# Altium footprint library 4.11-MX1.25连接器.PcbLib: 64 footprints (part 3 of 4)
Each footprint in its own frame and in the unit in brackets; x right, y up, seen from the top. Pads: shape width x height; smd on the part's side, far side on the other; paste and mask are expansions set on the pad; w line width, h text height; cw(c..) or ccw(c..) is an arc to the next point about the centre after c.
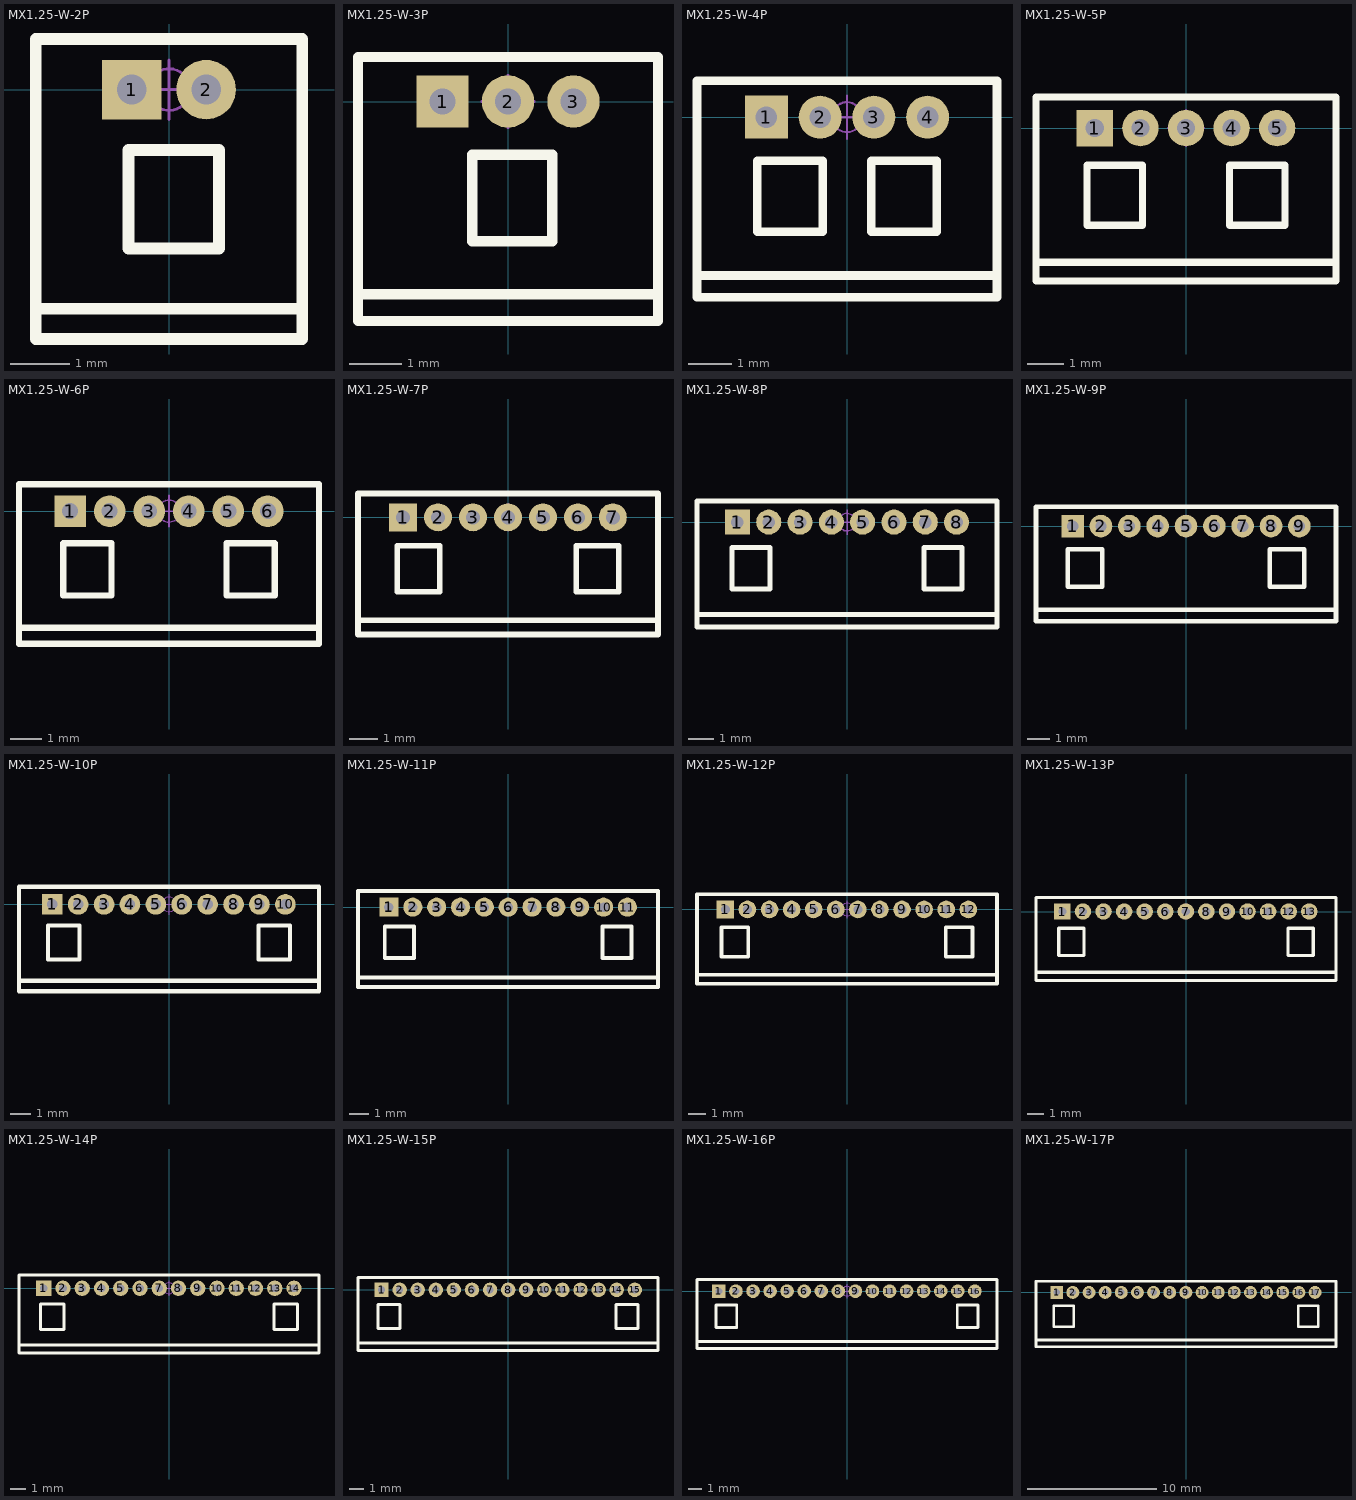
[diagram p2: the footprints below, top view; thin cyan lines are the x and y axes]

## MX1.25-W-2P [mm] "长：4.25mm，宽：1.8mm，高：3.3mm"
pads (2):
  rect 1x1 hole 0.5: 1(-0.625,0)
  round 1 hole 0.5: 2(0.625,0)
Top Overlay:
  lines w0.2: -2.239,-3.683 2.239,-3.683 ; -2.239,-4.191 2.239,-4.191 2.239,0.85 -2.239,0.85 -2.239,-4.191 ; -0.682,-2.667 0.842,-2.667 0.842,-1.016 -0.682,-1.016 -0.682,-2.667
Mechanical 15:
  circle w0.05: c0,0 r0.35
  lines w0.05: -0.5,0 0.5,0 ; 0,-0.5 0,0.5
3D body: height 3.35, standoff -2.1, extent -2.125,-4.05 2.125,0.85

## MX1.25-W-3P [mm] "长：5.5mm，宽：1.8mm，高：3.3mm"
pads (3):
  rect 1x1 hole 0.5: 1(-1.25,0)
  round 1 hole 0.5: 2(0,0) 3(1.25,0)
Top Overlay:
  lines w0.2: -2.864,-3.683 2.864,-3.683 ; -2.864,-4.191 -2.864,0.85 2.864,0.85 2.864,-4.191 -2.864,-4.191 ; -0.682,-2.667 -0.682,-1.016 0.842,-1.016 0.842,-2.667 -0.682,-2.667
Mechanical 15:
  circle w0.05: c0,0 r0.35
  lines w0.05: -0.5,0 0.5,0 ; 0,-0.5 0,0.5
3D body: height 3.35, standoff -2.1, extent -2.75,-4.05 2.75,0.85

## MX1.25-W-4P [mm] "长：6.75mm，宽：1.8mm，高：3.3mm"
pads (4):
  rect 1x1 hole 0.5: 1(-1.875,0)
  round 1 hole 0.5: 2(-0.625,0) 3(0.625,0) 4(1.875,0)
Top Overlay:
  lines w0.2: -3.489,-3.683 3.489,-3.683 ; -3.489,-4.191 -3.489,0.85 3.489,0.85 3.489,-4.191 -3.489,-4.191 ; -2.092,-2.667 -0.568,-2.667 -0.568,-1.016 -2.092,-1.016 -2.092,-2.667 ; 0.568,-2.667 2.092,-2.667 2.092,-1.016 0.568,-1.016 0.568,-2.667
Mechanical 15:
  circle w0.05: c0,0 r0.35
  lines w0.05: -0.5,0 0.5,0 ; 0,-0.5 0,0.5
3D body: height 1.59, standoff -3.86, extent -3.375,-4.05 3.375,0.85

## MX1.25-W-5P [mm] "长：8mm，宽：1.8mm，高：3.3mm"
pads (5):
  rect 1x1 hole 0.5: 1(-2.5,0)
  round 1 hole 0.5: 2(-1.25,0) 3(0,0) 4(1.25,0) 5(2.5,0)
Top Overlay:
  lines w0.2: -4.114,-3.683 4.114,-3.683 ; -4.114,-4.191 -4.114,0.85 4.114,0.85 4.114,-4.191 -4.114,-4.191 ; -2.717,-2.667 -1.193,-2.667 -1.193,-1.016 -2.717,-1.016 -2.717,-2.667 ; 1.193,-2.667 2.717,-2.667 2.717,-1.016 1.193,-1.016 1.193,-2.667
Mechanical 15:
  circle w0.05: c0,0 r0.35
  lines w0.05: -0.5,0 0.5,0 ; 0,-0.5 0,0.5
3D body: height 1.59, standoff -3.86, extent -4,-4.05 4,0.85

## MX1.25-W-6P [mm] "长：9.25mm，宽：1.8mm，高：3.3mm"
pads (6):
  rect 1x1 hole 0.5: 1(-3.125,0)
  round 1 hole 0.5: 2(-1.875,0) 3(-0.625,0) 4(0.625,0) 5(1.875,0) 6(3.125,0)
Top Overlay:
  lines w0.2: -4.739,-3.683 4.739,-3.683 ; -4.739,-4.191 4.739,-4.191 4.739,0.85 -4.739,0.85 -4.739,-4.191 ; -3.342,-2.667 -1.818,-2.667 -1.818,-1.016 -3.342,-1.016 -3.342,-2.667 ; 1.818,-2.667 3.342,-2.667 3.342,-1.016 1.818,-1.016 1.818,-2.667
Mechanical 15:
  circle w0.05: c0,0 r0.35
  lines w0.05: -0.5,0 0.5,0 ; 0,-0.5 0,0.5
3D body: height 3.35, standoff -2.1, extent -4.625,-4.05 4.625,0.85

## MX1.25-W-7P [mm] "长：10.5mm，宽：1.8mm，高：3.3mm"
pads (7):
  rect 1x1 hole 0.5: 1(-3.75,0)
  round 1 hole 0.5: 2(-2.5,0) 3(-1.25,0) 4(0,0) 5(1.25,0) 6(2.5,0) 7(3.75,0)
Top Overlay:
  lines w0.2: -5.364,-3.683 5.364,-3.683 ; -5.364,-4.191 5.364,-4.191 5.364,0.85 -5.364,0.85 -5.364,-4.191 ; -3.967,-2.667 -3.967,-1.016 -2.443,-1.016 -2.443,-2.667 -3.967,-2.667 ; 2.443,-2.667 2.443,-1.016 3.967,-1.016 3.967,-2.667 2.443,-2.667
Mechanical 15:
  circle w0.05: c0,0 r0.35
  lines w0.05: -0.5,0 0.5,0 ; 0,-0.5 0,0.5
3D body: height 3.35, standoff -2.1, extent -5.25,-4.05 5.25,0.85

## MX1.25-W-8P [mm] "长：11.75mm，宽：1.8mm，高：3.3mm"
pads (8):
  rect 1x1 hole 0.5: 1(-4.375,0)
  round 1 hole 0.5: 2(-3.125,0) 3(-1.875,0) 4(-0.625,0) 5(0.625,0) 6(1.875,0) 7(3.125,0) 8(4.375,0)
Top Overlay:
  lines w0.2: -5.989,-3.683 5.989,-3.683 ; -5.989,-4.191 5.989,-4.191 5.989,0.85 -5.989,0.85 -5.989,-4.191 ; -4.592,-2.667 -3.068,-2.667 -3.068,-1.016 -4.592,-1.016 -4.592,-2.667 ; 3.068,-2.667 4.592,-2.667 4.592,-1.016 3.068,-1.016 3.068,-2.667
Mechanical 15:
  circle w0.05: c0,0 r0.35
  lines w0.05: -0.5,0 0.5,0 ; 0,-0.5 0,0.5
3D body: height 3.35, standoff -2.1, extent -5.875,-4.05 5.875,0.85

## MX1.25-W-9P [mm] "长：13mm，宽：1.8mm，高：3.3mm"
pads (9):
  rect 1x1 hole 0.5: 1(-5,0)
  round 1 hole 0.5: 2(-3.75,0) 3(-2.5,0) 4(-1.25,0) 5(0,0) 6(1.25,0) 7(2.5,0) 8(3.75,0) 9(5,0)
Top Overlay:
  lines w0.2: -6.614,-3.683 6.614,-3.683 ; -6.614,-4.191 6.614,-4.191 6.614,0.85 -6.614,0.85 -6.614,-4.191 ; -5.217,-2.667 -5.217,-1.016 -3.693,-1.016 -3.693,-2.667 -5.217,-2.667 ; 3.693,-2.667 5.217,-2.667 5.217,-1.016 3.693,-1.016 3.693,-2.667
Mechanical 15:
  circle w0.05: c0,0 r0.35
  lines w0.05: -0.5,0 0.5,0 ; 0,-0.5 0,0.5
3D body: height 3.35, standoff -2.1, extent -6.5,-4.05 6.5,0.85

## MX1.25-W-10P [mm] "长：14.5mm，宽：1.8mm，高：3.3mm"
pads (10):
  rect 1x1 hole 0.5: 1(-5.635,0)
  round 1 hole 0.5: 2(-4.385,0) 3(-3.135,0) 4(-1.885,0) 5(-0.635,0) 6(0.615,0) 7(1.865,0) 8(3.115,0) 9(4.365,0) 10(5.615,0)
Top Overlay:
  lines w0.2: -7.239,-3.683 7.239,-3.683 ; -7.239,-4.191 -7.239,0.85 7.239,0.85 7.239,-4.191 -7.239,-4.191 ; -5.842,-2.667 -4.318,-2.667 -4.318,-1.016 -5.842,-1.016 -5.842,-2.667 ; 4.318,-2.667 5.842,-2.667 5.842,-1.016 4.318,-1.016 4.318,-2.667
Mechanical 15:
  circle w0.05: c0,0 r0.35
  lines w0.05: -0.5,0 0.5,0 ; 0,-0.5 0,0.5
3D body: height 3.35, standoff -2.1, extent -7.125,-4.05 7.125,0.85

## MX1.25-W-11P [mm] "长：15.5mm，宽：1.8mm，高：3.3mm"
pads (11):
  rect 1x1 hole 0.5: 1(-6.26,0)
  round 1 hole 0.5: 2(-5.01,0) 3(-3.76,0) 4(-2.51,0) 5(-1.26,0) 6(-0.01,0) 7(1.24,0) 8(2.49,0) 9(3.74,0) 10(4.99,0) 11(6.24,0)
Top Overlay:
  lines w0.2: -7.884,-3.683 7.844,-3.683 ; -7.884,-4.191 7.844,-4.191 7.844,0.85 -7.884,0.85 -7.884,-4.191 ; -6.477,-2.667 -4.953,-2.667 -4.953,-1.016 -6.477,-1.016 -6.477,-2.667 ; 4.933,-2.667 4.933,-1.016 6.457,-1.016 6.457,-2.667 4.933,-2.667
Mechanical 15:
  circle w0.05: c0,0 r0.35
  lines w0.05: -0.5,0 0.5,0 ; 0,-0.5 0,0.5
3D body: height 3.35, standoff -2.1, extent -7.76,-4.05 7.74,0.85

## MX1.25-W-12P [mm] "长：16.75mm，宽：1.8mm，高：3.3mm"
pads (12):
  rect 1x1 hole 0.5: 1(-6.885,0)
  round 1 hole 0.5: 2(-5.635,0) 3(-4.385,0) 4(-3.135,0) 5(-1.885,0) 6(-0.635,0) 7(0.615,0) 8(1.865,0) 9(3.115,0) 10(4.365,0) 11(5.615,0) 12(6.865,0)
Top Overlay:
  lines w0.2: -8.489,-3.683 8.489,-3.683 ; -8.489,-4.191 8.489,-4.191 8.489,0.85 -8.489,0.85 -8.489,-4.191 ; -7.102,-2.667 -7.102,-1.016 -5.578,-1.016 -5.578,-2.667 -7.102,-2.667 ; 5.578,-2.667 7.102,-2.667 7.102,-1.016 5.578,-1.016 5.578,-2.667
Mechanical 15:
  circle w0.05: c0,0 r0.35
  lines w0.05: -0.5,0 0.5,0 ; 0,-0.5 0,0.5
3D body: height 3.35, standoff -2.1, extent -8.375,-4.05 8.375,0.85

## MX1.25-W-13P [mm] "长：18mm，宽：1.8mm，高：3.3mm"
pads (13):
  rect 1x1 hole 0.5: 1(-7.51,0)
  round 1 hole 0.5: 2(-6.26,0) 3(-5.01,0) 4(-3.76,0) 5(-2.51,0) 6(-1.26,0) 7(-0.01,0) 8(1.24,0) 9(2.49,0) 10(3.74,0) 11(4.99,0) 12(6.24,0) 13(7.49,0)
Top Overlay:
  lines w0.2: -9.114,-3.683 9.114,-3.683 ; -9.114,-4.191 -9.114,0.85 9.114,0.85 9.114,-4.191 -9.114,-4.191 ; -7.727,-2.667 -6.203,-2.667 -6.203,-1.016 -7.727,-1.016 -7.727,-2.667 ; 6.203,-2.667 6.203,-1.016 7.727,-1.016 7.727,-2.667 6.203,-2.667
Mechanical 15:
  circle w0.05: c0,0 r0.35
  lines w0.05: -0.5,0 0.5,0 ; 0,-0.5 0,0.5
3D body: height 3.35, standoff -2.1, extent -9.01,-4.05 8.99,0.85

## MX1.25-W-14P [mm] "长：19.25mm，宽：1.8mm，高：3.3mm"
pads (14):
  rect 1x1 hole 0.5: 1(-8.135,0)
  round 1 hole 0.5: 2(-6.885,0) 3(-5.635,0) 4(-4.385,0) 5(-3.135,0) 6(-1.885,0) 7(-0.635,0) 8(0.615,0) 9(1.865,0) 10(3.115,0) 11(4.365,0) 12(5.615,0) 13(6.865,0) 14(8.115,0)
Top Overlay:
  lines w0.2: -9.739,-3.683 9.739,-3.683 ; -9.739,-4.191 -9.739,0.85 9.739,0.85 9.739,-4.191 -9.739,-4.191 ; -8.352,-2.667 -8.352,-1.016 -6.828,-1.016 -6.828,-2.667 -8.352,-2.667 ; 6.828,-2.667 8.352,-2.667 8.352,-1.016 6.828,-1.016 6.828,-2.667
Mechanical 15:
  circle w0.05: c0,0 r0.35
  lines w0.05: -0.5,0 0.5,0 ; 0,-0.5 0,0.5
3D body: height 3.35, standoff -2.1, extent -9.625,-4.05 9.625,0.85

## MX1.25-W-15P [mm] "长：20.5mm，宽：1.8mm，高：3.3mm"
pads (15):
  rect 1x1 hole 0.5: 1(-8.76,0)
  round 1 hole 0.5: 2(-7.51,0) 3(-6.26,0) 4(-5.01,0) 5(-3.76,0) 6(-2.51,0) 7(-1.26,0) 8(-0.01,0) 9(1.24,0) 10(2.49,0) 11(3.74,0) 12(4.99,0) 13(6.24,0) 14(7.49,0) 15(8.74,0)
Top Overlay:
  lines w0.2: -10.384,-3.683 10.344,-3.683 ; -10.384,-4.191 10.344,-4.191 10.344,0.85 -10.384,0.85 -10.384,-4.191 ; -8.997,-2.667 -8.997,-1.016 -7.473,-1.016 -7.473,-2.667 -8.997,-2.667 ; 7.433,-2.667 8.957,-2.667 8.957,-1.016 7.433,-1.016 7.433,-2.667
Mechanical 15:
  circle w0.05: c0,0 r0.35
  lines w0.05: -0.5,0 0.5,0 ; 0,-0.5 0,0.5
3D body: height 3.35, standoff -2.1, extent -10.26,-4.05 10.24,0.85

## MX1.25-W-16P [mm] "长：21.75mm，宽：1.8mm，高：3.3mm"
pads (16):
  rect 1x1 hole 0.5: 1(-9.385,0)
  round 1 hole 0.5: 2(-8.135,0) 3(-6.885,0) 4(-5.635,0) 5(-4.385,0) 6(-3.135,0) 7(-1.885,0) 8(-0.635,0) 9(0.615,0) 10(1.865,0) 11(3.115,0) 12(4.365,0) 13(5.615,0) 14(6.865,0) 15(8.115,0) 16(9.365,0)
Top Overlay:
  lines w0.2: -10.989,-3.683 10.989,-3.683 ; -10.989,-4.191 -10.989,0.85 10.989,0.85 10.989,-4.191 -10.989,-4.191 ; -9.602,-2.667 -9.602,-1.016 -8.078,-1.016 -8.078,-2.667 -9.602,-2.667 ; 8.078,-2.667 9.602,-2.667 9.602,-1.016 8.078,-1.016 8.078,-2.667
Mechanical 15:
  circle w0.05: c0,0 r0.35
  lines w0.05: -0.5,0 0.5,0 ; 0,-0.5 0,0.5
3D body: height 3.35, standoff -2.1, extent -10.875,-4.05 10.875,0.85

## MX1.25-W-17P [mm] "长：23mm，宽：1.8mm，高：3.3mm"
pads (17):
  rect 1x1 hole 0.5: 1(-10.01,0)
  round 1 hole 0.5: 2(-8.76,0) 3(-7.51,0) 4(-6.26,0) 5(-5.01,0) 6(-3.76,0) 7(-2.51,0) 8(-1.26,0) 9(-0.01,0) 10(1.24,0) 11(2.49,0) 12(3.74,0) 13(4.99,0) 14(6.24,0) 15(7.49,0) 16(8.74,0) 17(9.99,0)
Top Overlay:
  lines w0.2: -11.614,-3.683 11.614,-3.683 ; -11.614,-4.191 11.614,-4.191 11.614,0.85 -11.614,0.85 -11.614,-4.191 ; -10.227,-2.667 -8.703,-2.667 -8.703,-1.016 -10.227,-1.016 -10.227,-2.667 ; 8.703,-2.667 8.703,-1.016 10.227,-1.016 10.227,-2.667 8.703,-2.667
Mechanical 15:
  circle w0.05: c0,0 r0.35
  lines w0.05: -0.5,0 0.5,0 ; 0,-0.5 0,0.5
3D body: height 3.35, standoff -2.1, extent -11.51,-4.05 11.49,0.85